# Altium footprint library Herry.PcbLib: 58 footprints (part 4 of 4)
Each footprint in its own frame and in the unit in brackets; x right, y up, seen from the top. Pads: shape width x height; smd on the part's side, far side on the other; paste and mask are expansions set on the pad; w line width, h text height; cw(c..) or ccw(c..) is an arc to the next point about the centre after c.
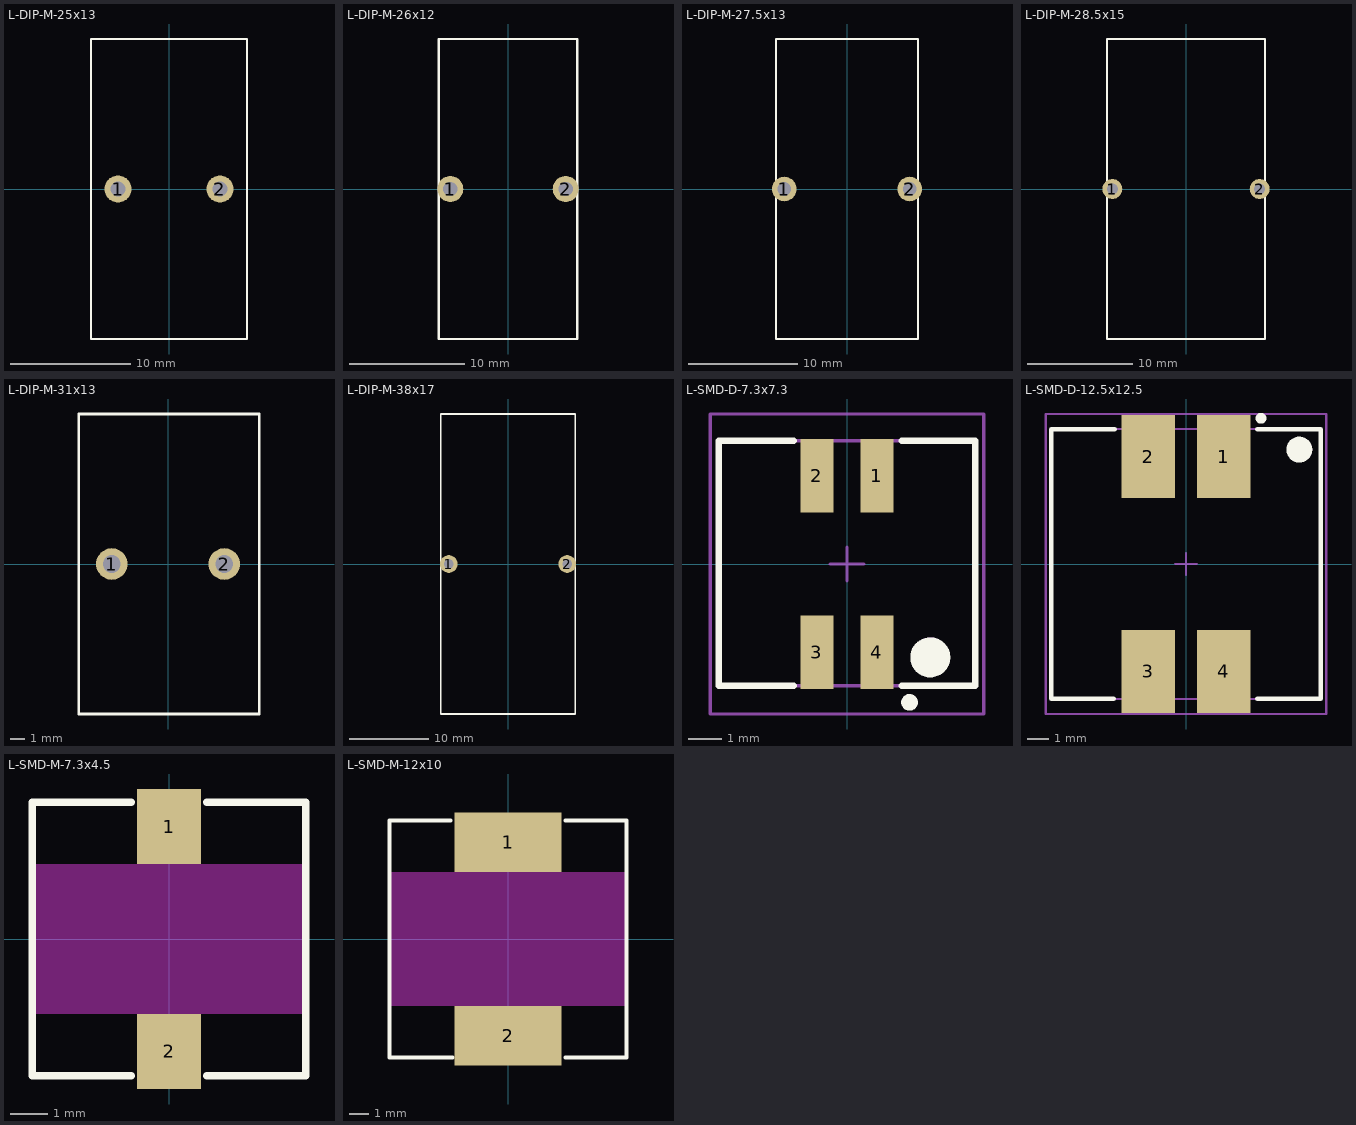
[diagram p3: the footprints below, top view; thin cyan lines are the x and y axes]

## L-DIP-M-25x13 [mm] "Body 25x13mm, 2 leads"
height 25
pads (2):
  round 2.25 hole 1.25: 1(-4.25,0) 2(4.25,0)
Top Overlay:
  lines w0.2: -6.5,-12.5 -6.5,12.5 6.5,12.5 6.5,-12.5 -6.5,-12.5
3D body "Download_STP_7447055.stp": height 25.48, standoff -14.5, extent -4.75,-12.494 4.75,12.493

## L-DIP-M-26x12 [mm] "Body 26x12mm, 2 leads"
height 26
pads (2):
  round 2.25 hole 1.25: 1(-5,0) 2(5,0)
Top Overlay:
  lines w0.2: -6,-13 -6,13 6,13 6,-13 -6,-13
3D body "7447065.stp": height 25.48, standoff -14.5, extent -4.75,-12.494 4.75,12.493

## L-DIP-M-27.5x13 [mm] "Body 27.5x13mm, 2 leads"
height 27.5
pads (2):
  round 2.25 hole 1.25: 1(-5.75,0) 2(5.75,0)
Top Overlay:
  lines w0.2: -6.5,-13.75 -6.5,13.75 6.5,13.75 6.5,-13.75 -6.5,-13.75
3D body "7447076.stp": height 28.22, standoff -11.95, extent -6.5,-13.741 6.5,13.744

## L-DIP-M-28.5x15 [mm] "Body 28.5x15mm, 2 leads"
height 28.5
pads (2):
  round 1.9 hole 1.05: 1(-7,0) 2(7,0)
Top Overlay:
  lines w0.2: -7.5,-14.25 7.5,-14.25 7.5,14.25 -7.5,14.25 -7.5,-14.25
3D body "7447075.stp": height 30.65, standoff -23.75, extent -8.42,-15.164 8.42,15.163

## L-DIP-M-31x13 [mm]
height 19
pads (2):
  round 2.25 hole 1.25: 1(-4,0) 2(4,0)
Top Overlay:
  lines w0.2: -6.35,-10.668 -6.35,10.668 6.477,10.668 6.477,-10.668 -6.35,-10.668
3D body "7447017.stp": height 20.93, standoff -14, extent -6.27,-10.493 6.27,10.497

## L-DIP-M-38x17 [mm] "Body 38x17mm, 2 leads"
height 38
pads (2):
  round 2.25 hole 1.25: 1(-7.5,0) 2(7.5,0)
Top Overlay:
  lines w0.2: -8.5,-19 -8.5,19 8.5,19 8.5,-19 -8.5,-19
3D body "7447019.stp": height 40.49, standoff -13.5, extent -9.52,-20.01 9.52,20.01

## L-SMD-D-7.3x7.3 [mm] "SMD Inductor,  4-Leads, Body 7.3x7.3mm (max)"
height 4.8
pads (4):
  rect 1x2.2 smd: 1(0.9,2.65) 2(-0.9,2.65) 3(-0.9,-2.65) 4(0.9,-2.65)
Top Overlay:
  circle w0.25: c1.875,-4.15 r0.125
  circle w0.6: c2.5,-2.8 r0.3
  lines w0.2: -1.6,-3.65 -3.85,-3.65 -3.85,3.7 -1.6,3.7 ; 1.65,-3.65 3.85,-3.65 3.85,3.65 ; 1.65,3.7 3.85,3.7
Mechanical 13:
  circle w0.1: c2.5,-2.75 r0.5
  lines w0.1: -3.85,-3.65 3.85,-3.65 3.85,3.7 -3.85,3.7 -3.85,-3.65
Mechanical 15:
  lines w0.1: -0.5,0 0.5,0 ; 0,-0.5 0,0.5 ; -4.1,-4.5 4.1,-4.5 4.1,4.5 -4.1,4.5 -4.1,-4.5
3D body "WE-DD_7345_Straight.stp": height 4.76, standoff -0.04, extent -3.65,-3.65 3.65,3.65

## L-SMD-D-12.5x12.5 [mm] "SMD Inductor, 4-Leads, Body 12.5x12.5mm (max)"
height 8.5
pads (4):
  rect 2.5x3.85 smd: 1(1.75,4.975) 2(-1.75,4.975) 3(-1.75,-4.975) 4(1.75,-4.975)
Top Overlay:
  circle w0.6: c5.25,5.3 r0.3
  circle w0.25: c3.475,6.75 r0.125
  lines w0.2: -6.25,-6.25 -6.25,6.25 -3.3,6.25 ; -6.2,-6.25 -3.35,-6.25 ; 3.3,-6.25 6.25,-6.25 6.25,6.25 3.3,6.25
Mechanical 13:
  circle w0.1: c5.3,5.3 r0.5
  lines w0.1: -6.25,-6.25 -6.25,6.25 6.25,6.25 6.25,-6.25 -6.25,-6.25
Mechanical 15:
  lines w0.1: -0.5,0 0.5,0 ; 0,-0.5 0,0.5 ; -6.5,-6.95 -6.5,6.95 6.5,6.95 6.5,-6.95 -6.5,-6.95
3D body "WE-DD_1280_Crossed.stp": height 8.6, standoff 0, extent -6.25,-6.25 6.25,6.25

## L-SMD-M-7.3x4.5 [mm] "WE-PDA SMD Shielded Power Inductor, 7345"
height 4
pads (2):
  rect 1.7x2 smd: 1(0,3) 2(0,-3)
Top Layer keep-out:
  rectangle: -3.65,-2 3.65,2
Top Overlay:
  lines w0.2: -1,-3.65 -3.65,-3.65 -3.65,3.65 -1,3.65 ; 1,-3.65 3.65,-3.65 3.65,3.65 1,3.65
3D body "IndPDA_7345.stp": height 4.05, standoff 0.05, extent -3.65,-3.65 3.65,3.65

## L-SMD-M-12x10 [mm] "WE-PDA SMD Shielded Power Inductor, 1210"
height 10
pads (2):
  rect 5.4x3 smd: 1(0,4.9) 2(0,-4.9)
Top Layer keep-out:
  rectangle: -6,-3.4 6,3.4
Top Overlay:
  lines w0.2: -2.9,6 -6,6 -6,-6 -2.8,-6 ; 2.9,-6 6,-6 6,6 2.9,6
3D body "IndPDA_1210.stp": height 9.7, standoff 0.04, extent -6,-6 6,6